# Altium footprint library BWRC.PcbLib: 51 footprints (part 2 of 4)
Each footprint in its own frame and in the unit in brackets; x right, y up, seen from the top. Pads: shape width x height; smd on the part's side, far side on the other; paste and mask are expansions set on the pad; w line width, h text height; cw(c..) or ccw(c..) is an arc to the next point about the centre after c.
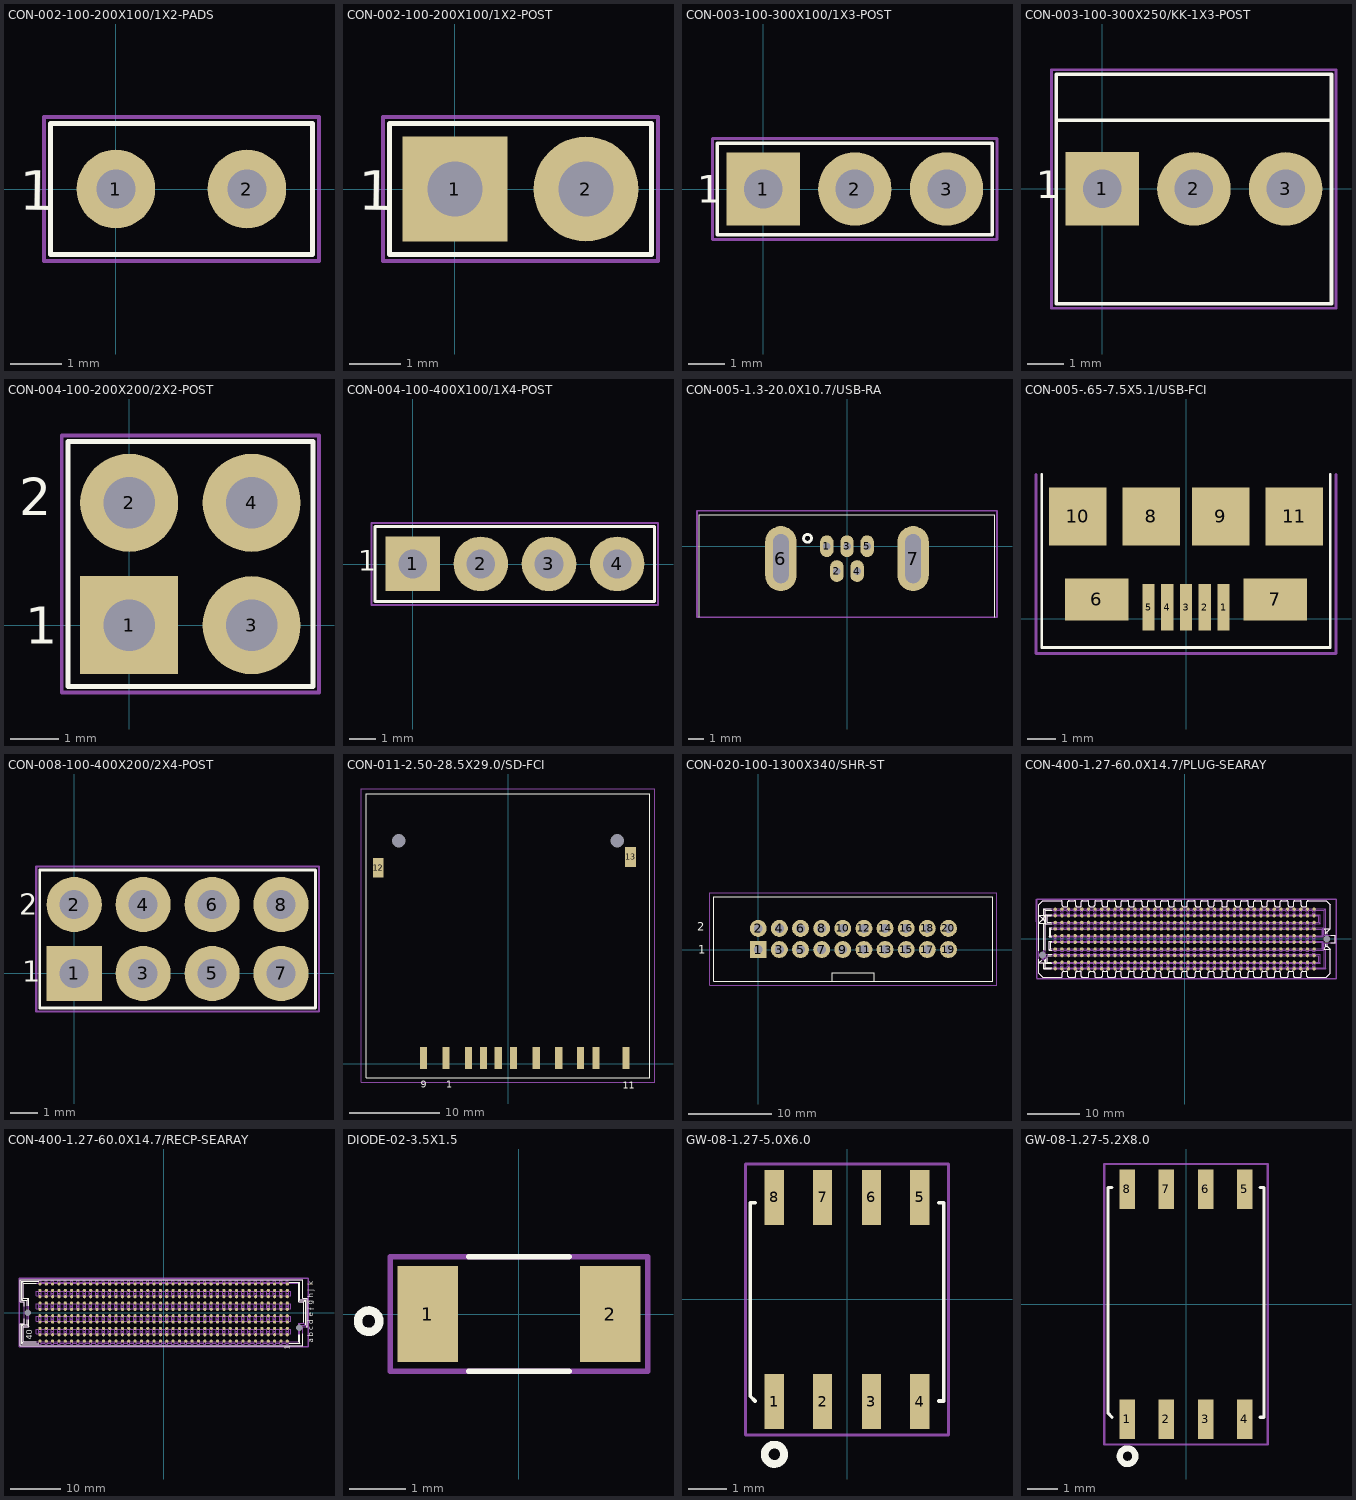
[diagram p1: the footprints below, top view; thin cyan lines are the x and y axes]

## CON-002-100-200X100/1X2-PADS [mil] "2 thru pads"
height 43.31
pads (2):
  round 60 hole 30: 1(0,0) 2(100,0)
Top Overlay:
  lines w4: -50,-50 -50,50 150,50 150,-50 -50,-50
  text "1" at -74,-16 h30
M15_Courtyard_Top:
  lines w3: -55,-55 155,-55 155,55 -55,55 -55,-55

## CON-002-100-200X100/1X2-POST [mil] "2 pin"
height 43.31
pads (2):
  rect 80x80 hole 42: 1(0,0)
  round 80 hole 42: 2(100,0)
Top Overlay:
  lines w4: -50,-50 -50,50 150,50 150,-50 -50,-50
  text "1" at -74,-16 h30
M15_Courtyard_Top:
  lines w3: -55,-55 155,-55 155,55 -55,55 -55,-55

## CON-003-100-300X100/1X3-POST [mil] "3-pin"
pads (3):
  rect 80x80 hole 42: 1(0,0)
  round 80 hole 42: 2(100,0) 3(200,0)
Top Overlay:
  lines w4: -50,-50 250,-50 250,50 -50,50 -50,-50
  text "1" at -72,-15 h30
M15_Courtyard_Top:
  lines w3: -55,-55 255,-55 255,55 -55,55 -55,-55

## CON-003-100-300X250/KK-1X3-POST [mil]
pads (3):
  rect 80x80 hole 42: 1(0,0)
  round 80 hole 42: 2(100.1,0) 3(200.1,0)
Top Overlay:
  lines w4: -50,75 250.1,75 ; -50,-125.1 250.1,-125.1 250.1,125 -50,125 -50,-125.1
  text "1" at -72,-10.1 h30
M15_Courtyard_Top:
  lines w3: -55,-130.1 -55,129.9 255,129.9 255,-130.1 -55,-130.1

## CON-004-100-200X200/2X2-POST [mil]
pads (4):
  rect 80x80 hole 42: 1(0,0)
  round 80 hole 42: 2(0,100) 3(100,0) 4(100,100)
Top Overlay:
  lines w4: -50,-50 150,-50 150,150 -50,150 -50,-50
  text "2" at -90,90 h30
  text "1" at -85,-15 h30
M15_Courtyard_Top:
  lines w3: -55,-55 155,-55 155,155 -55,155 -55,-55

## CON-004-100-400X100/1X4-POST [mil]
pads (4):
  rect 80x80 hole 42: 1(0.1,0.1)
  round 80 hole 42: 2(100.1,0.1) 3(200.1,0.1) 4(300.1,0.1)
Top Overlay:
  lines w4: -55,-55 -55,55 355,55 355,-55 -55,-55
  text "1" at -80,-10 h30
M15_Courtyard_Top:
  lines w3: -60,-60 -60,60 360,60 360,-60 -60,-60

## CON-005-1.3-20.0X10.7/USB-RA [mil]
pads (7):
  rrect98% 34x55 hole 19: 1(-51.18,0) 2(-25.59,-62.99) 3(0,0) 4(25.59,-62.99) 5(51.18,0)
  oval 80x164.96 hole 39.37 slot 124.02 at 90 deg: 6(-167.32,-31.5) 7(167.32,-31.5)
Top Overlay:
  circle w7: c-100,20 r10
  lines w3: -374.02,-179.98 -374.02,80 374.02,80 374.02,-179.98
M15_Courtyard_Top:
  lines w4: -380,-180 380,-180 380,90 -380,90 -380,-180

## CON-005-.65-7.5X5.1/USB-FCI [mm]
pads (11):
  rect 0.43x1.6 smd: 1(1.3,0.4) 2(0.65,0.4) 3(0,0.4) 4(-0.65,0.4) 5(-1.3,0.4)
  rect 2.2x1.45 smd: 6(-3.1,0.675) 7(3.1,0.675)
  rect 2x2 smd: 8(-1.2,3.55) 9(1.2,3.55) 10(-3.75,3.55) 11(3.75,3.55)
Top Overlay:
  lines w0.102: -5,5 -5,-1 5,-1 5,5
M15_Courtyard_Top:
  lines w0.102: -5.2,5 -5.2,-1.2 5.2,-1.2 5.2,5

## CON-008-100-400X200/2X4-POST [mil]
height 100
pads (8):
  rect 80x80 hole 42: 1(0,0)
  round 80 hole 42: 2(0,100) 3(100,0) 4(100,100) 5(200,0) 6(200,100) 7(300,0) 8(300,100)
Top Overlay:
  lines w4: -50,-50 350,-50 350,150 -50,150 -50,-50
  text "2" at -80,85 h30
  text "1" at -75,-12 h30
M15_Courtyard_Top:
  lines w3: -55,-55 355,-55 355,155 -55,155 -55,-55

## CON-011-2.50-28.5X29.0/SD-FCI [mm]
pads (15):
  rect 0.8x2.45 smd: 1(-6.875,0.625) 2(-4.375,0.625) 3(-1.075,0.625) 4(0.625,0.625) 5(3.125,0.625) 6(5.625,0.625) 7(8.05,0.625) 8(9.75,0.625) 9(-9.375,0.625) 10(-2.725,0.625) 11(13.1,0.625)
  rect 1.2x2.2 smd: 12(-14.4,21.75) 13(13.6,22.95)
  round 0 hole 1.5 unplated: 14(-12.1,24.75) 15(12.1,24.75)
Top Overlay:
  lines w0.102: -15.748,-1.524 15.748,-1.524 15.748,29.972 -15.748,29.972 -15.748,-1.524
  text "11" at 12.7,-2.794 h0.76
  text "1" at -6.858,-2.667 h0.76
  text "9" at -9.652,-2.667 h0.76
M15_Courtyard_Top:
  lines w0.076: -16.256,-2.032 -16.256,30.48 16.256,30.48 16.256,-2.032 ; -16.256,-2.032 16.256,-2.032 ; -16.256,-2.032 16.256,-2.032
  text "11" at 20.066,-6.096 h0.76

## CON-020-100-1300X340/SHR-ST [mil]
pads (20):
  rect 80x80 hole 42: 1(0,0)
  round 80 hole 42: 2(0,100.1) 3(100,0) 4(100,100.1) 5(200,0) 6(200,100.1) 7(300,0) 8(300,100.1) 9(400,0) 10(400,100.1) 11(500.1,0) 12(500.1,100.1) 13(600.1,0) 14(600.1,100.1) 15(700.1,0) 16(700.1,100.1) 17(800.1,0) 18(800.1,100.1) 19(900.1,0) 20(900.1,100.1)
Top Overlay:
  lines w4: 350,-150 350,-110 550.1,-110 550.1,-149.9 ; -210,-150 -210,250 1110,250 1110,-150 -210,-150
  text "2" at -290,90 h40
  text "1" at -285,-20 h40
M15_Courtyard_Top:
  lines w3: -230,-170 1130,-170 1130,270 -230,270 -230,-170

## CON-400-1.27-60.0X14.7/PLUG-SEARAY [mm] "Connector VITA 57, 400 Male contacts in 10 rows abcdefghij"
height 6.1
pads (402):
  oval 0x1 hole 1.3 unplated: 1(-27.191,-3.048) 2(27.191,0)
  round 0.64 smd: a1(24.765,5.715) a2(23.495,5.715) a3(22.225,5.715) a4(20.955,5.715) a5(19.685,5.715) a6(18.415,5.715) a7(17.145,5.715) a8(15.875,5.715) a9(14.605,5.715) a10(13.335,5.715) a11(12.065,5.715) a12(10.795,5.715) a13(9.525,5.715) a14(8.255,5.715) a15(6.985,5.715) a16(5.715,5.715) a17(4.445,5.715) a18(3.175,5.715) a19(1.905,5.715) a20(0.635,5.715) a21(-0.635,5.715) a22(-1.905,5.715) a23(-3.175,5.715) a24(-4.445,5.715) a25(-5.715,5.715) a26(-6.985,5.715) a27(-8.255,5.715) a28(-9.525,5.715) a29(-10.795,5.715) a30(-12.065,5.715) a31(-13.335,5.715) a32(-14.605,5.715) a33(-15.875,5.715) a34(-17.145,5.715) a35(-18.415,5.715) a36(-19.685,5.715) a37(-20.955,5.715) a38(-22.225,5.715) a39(-23.495,5.715) a40(-24.765,5.715) b1(24.765,4.445) b2(23.495,4.445) b3(22.225,4.445) b4(20.955,4.445) b5(19.685,4.445) b6(18.415,4.445) b7(17.145,4.445) b8(15.875,4.445) b9(14.605,4.445) b10(13.335,4.445) b11(12.065,4.445) b12(10.795,4.445) b13(9.525,4.445) b14(8.255,4.445) b15(6.985,4.445) b16(5.715,4.445) b17(4.445,4.445) b18(3.175,4.445) b19(1.905,4.445) b20(0.635,4.445) b21(-0.635,4.445) b22(-1.905,4.445) b23(-3.175,4.445) b24(-4.445,4.445) b25(-5.715,4.445) b26(-6.985,4.445) b27(-8.255,4.445) b28(-9.525,4.445) b29(-10.795,4.445) b30(-12.065,4.445) b31(-13.335,4.445) b32(-14.605,4.445) b33(-15.875,4.445) b34(-17.145,4.445) b35(-18.415,4.445) b36(-19.685,4.445) b37(-20.955,4.445) b38(-22.225,4.445) b39(-23.495,4.445) b40(-24.765,4.445) c1(24.765,3.175) c2(23.495,3.175) c3(22.225,3.175) c4(20.955,3.175) c5(19.685,3.175) c6(18.415,3.175) c7(17.145,3.175) c8(15.875,3.175) c9(14.605,3.175) c10(13.335,3.175) c11(12.065,3.175) c12(10.795,3.175) c13(9.525,3.175) c14(8.255,3.175) c15(6.985,3.175) c16(5.715,3.175) c17(4.445,3.175) c18(3.175,3.175) c19(1.905,3.175) c20(0.635,3.175) c21(-0.635,3.175) c22(-1.905,3.175) c23(-3.175,3.175) c24(-4.445,3.175) c25(-5.715,3.175) c26(-6.985,3.175) c27(-8.255,3.175) c28(-9.525,3.175) c29(-10.795,3.175) c30(-12.065,3.175) c31(-13.335,3.175) c32(-14.605,3.175) c33(-15.875,3.175) c34(-17.145,3.175) c35(-18.415,3.175) c36(-19.685,3.175) c37(-20.955,3.175) c38(-22.225,3.175) c39(-23.495,3.175) c40(-24.765,3.175) d1(24.765,1.905) d2(23.495,1.905) d3(22.225,1.905) d4(20.955,1.905) d5(19.685,1.905) d6(18.415,1.905) d7(17.145,1.905) d8(15.875,1.905) d9(14.605,1.905) d10(13.335,1.905) d11(12.065,1.905) d12(10.795,1.905) d13(9.525,1.905) d14(8.255,1.905) d15(6.985,1.905) d16(5.715,1.905) d17(4.445,1.905) d18(3.175,1.905) d19(1.905,1.905) d20(0.635,1.905) d21(-0.635,1.905) d22(-1.905,1.905) d23(-3.175,1.905) d24(-4.445,1.905) d25(-5.715,1.905) d26(-6.985,1.905) d27(-8.255,1.905) d28(-9.525,1.905) d29(-10.795,1.905) d30(-12.065,1.905) d31(-13.335,1.905) d32(-14.605,1.905) d33(-15.875,1.905) d34(-17.145,1.905) d35(-18.415,1.905) d36(-19.685,1.905) d37(-20.955,1.905) d38(-22.225,1.905) d39(-23.495,1.905) d40(-24.765,1.905) e1(24.765,0.635) e2(23.495,0.635) e3(22.225,0.635) e4(20.955,0.635) e5(19.685,0.635) e6(18.415,0.635) e7(17.145,0.635) e8(15.875,0.635) e9(14.605,0.635) e10(13.335,0.635) e11(12.065,0.635) e12(10.795,0.635) e13(9.525,0.635) e14(8.255,0.635) e15(6.985,0.635) e16(5.715,0.635) e17(4.445,0.635) e18(3.175,0.635) e19(1.905,0.635) e20(0.635,0.635) e21(-0.635,0.635) e22(-1.905,0.635) e23(-3.175,0.635) e24(-4.445,0.635) e25(-5.715,0.635) e26(-6.985,0.635) e27(-8.255,0.635) e28(-9.525,0.635) e29(-10.795,0.635) e30(-12.065,0.635) e31(-13.335,0.635) e32(-14.605,0.635) e33(-15.875,0.635) e34(-17.145,0.635) e35(-18.415,0.635) e36(-19.685,0.635) e37(-20.955,0.635) e38(-22.225,0.635) e39(-23.495,0.635) e40(-24.765,0.635) f1(24.765,-0.635) f2(23.495,-0.635) f3(22.225,-0.635) f4(20.955,-0.635) f5(19.685,-0.635) f6(18.415,-0.635) f7(17.145,-0.635) f8(15.875,-0.635) f9(14.605,-0.635) f10(13.335,-0.635) f11(12.065,-0.635) f12(10.795,-0.635) f13(9.525,-0.635) f14(8.255,-0.635) f15(6.985,-0.635) f16(5.715,-0.635) f17(4.445,-0.635) f18(3.175,-0.635) f19(1.905,-0.635) f20(0.635,-0.635) f21(-0.635,-0.635) f22(-1.905,-0.635) f23(-3.175,-0.635) f24(-4.445,-0.635) f25(-5.715,-0.635) f26(-6.985,-0.635) f27(-8.255,-0.635) f28(-9.525,-0.635) f29(-10.795,-0.635) f30(-12.065,-0.635) f31(-13.335,-0.635) f32(-14.605,-0.635) f33(-15.875,-0.635) f34(-17.145,-0.635) f35(-18.415,-0.635) f36(-19.685,-0.635) f37(-20.955,-0.635) f38(-22.225,-0.635) f39(-23.495,-0.635) f40(-24.765,-0.635) g1(24.765,-1.905) g2(23.495,-1.905) g3(22.225,-1.905) g4(20.955,-1.905) g5(19.685,-1.905) g6(18.415,-1.905) g7(17.145,-1.905) g8(15.875,-1.905) g9(14.605,-1.905) g10(13.335,-1.905) g11(12.065,-1.905) g12(10.795,-1.905) g13(9.525,-1.905) g14(8.255,-1.905) g15(6.985,-1.905) g16(5.715,-1.905) g17(4.445,-1.905) g18(3.175,-1.905) g19(1.905,-1.905) g20(0.635,-1.905) g21(-0.635,-1.905) g22(-1.905,-1.905) g23(-3.175,-1.905) g24(-4.445,-1.905) g25(-5.715,-1.905) g26(-6.985,-1.905) g27(-8.255,-1.905) g28(-9.525,-1.905) g29(-10.795,-1.905) g30(-12.065,-1.905) g31(-13.335,-1.905) g32(-14.605,-1.905) g33(-15.875,-1.905) g34(-17.145,-1.905) g35(-18.415,-1.905) g36(-19.685,-1.905) g37(-20.955,-1.905) g38(-22.225,-1.905) g39(-23.495,-1.905) g40(-24.765,-1.905) h1(24.765,-3.175) h2(23.495,-3.175) h3(22.225,-3.175) h4(20.955,-3.175) h5(19.685,-3.175) h6(18.415,-3.175) h7(17.145,-3.175) h8(15.875,-3.175) h9(14.605,-3.175) h10(13.335,-3.175) h11(12.065,-3.175) h12(10.795,-3.175) h13(9.525,-3.175) h14(8.255,-3.175) h15(6.985,-3.175) h16(5.715,-3.175) h17(4.445,-3.175) h18(3.175,-3.175) h19(1.905,-3.175) h20(0.635,-3.175) h21(-0.635,-3.175) h22(-1.905,-3.175) h23(-3.175,-3.175) h24(-4.445,-3.175) h25(-5.715,-3.175) h26(-6.985,-3.175) h27(-8.255,-3.175) h28(-9.525,-3.175) h29(-10.795,-3.175) h30(-12.065,-3.175) h31(-13.335,-3.175) h32(-14.605,-3.175) h33(-15.875,-3.175) h34(-17.145,-3.175) h35(-18.415,-3.175) h36(-19.685,-3.175) h37(-20.955,-3.175) h38(-22.225,-3.175) h39(-23.495,-3.175) h40(-24.765,-3.175) j1(24.765,-4.445) j2(23.495,-4.445) j3(22.225,-4.445) j4(20.955,-4.445) j5(19.685,-4.445) j6(18.415,-4.445) j7(17.145,-4.445) j8(15.875,-4.445) j9(14.605,-4.445) j10(13.335,-4.445) j11(12.065,-4.445) j12(10.795,-4.445) j13(9.525,-4.445) j14(8.255,-4.445) j15(6.985,-4.445) j16(5.715,-4.445) j17(4.445,-4.445) j18(3.175,-4.445) j19(1.905,-4.445) j20(0.635,-4.445) j21(-0.635,-4.445) j22(-1.905,-4.445) j23(-3.175,-4.445) j24(-4.445,-4.445) j25(-5.715,-4.445) j26(-6.985,-4.445) j27(-8.255,-4.445) j28(-9.525,-4.445) j29(-10.795,-4.445) j30(-12.065,-4.445) j31(-13.335,-4.445) j32(-14.605,-4.445) j33(-15.875,-4.445) j34(-17.145,-4.445) j35(-18.415,-4.445) j36(-19.685,-4.445) j37(-20.955,-4.445) j38(-22.225,-4.445) j39(-23.495,-4.445) j40(-24.765,-4.445) k1(24.765,-5.715) k2(23.495,-5.715) k3(22.225,-5.715) k4(20.955,-5.715) k5(19.685,-5.715) k6(18.415,-5.715) k7(17.145,-5.715) k8(15.875,-5.715) k9(14.605,-5.715) k10(13.335,-5.715) k11(12.065,-5.715) k12(10.795,-5.715) k13(9.525,-5.715) k14(8.255,-5.715) k15(6.985,-5.715) k16(5.715,-5.715) k17(4.445,-5.715) k18(3.175,-5.715) k19(1.905,-5.715) k20(0.635,-5.715) k21(-0.635,-5.715) k22(-1.905,-5.715) k23(-3.175,-5.715) k24(-4.445,-5.715) k25(-5.715,-5.715) k26(-6.985,-5.715) k27(-8.255,-5.715) k28(-9.525,-5.715) k29(-10.795,-5.715) k30(-12.065,-5.715) k31(-13.335,-5.715) k32(-14.605,-5.715) k33(-15.875,-5.715) k34(-17.145,-5.715) k35(-18.415,-5.715) k36(-19.685,-5.715) k37(-20.955,-5.715) k38(-22.225,-5.715) k39(-23.495,-5.715) k40(-24.765,-5.715)
Top Overlay:
  drawing of 637 lines, arcs and shapes, not listed
Bottom Overlay:
  text "j" at -28.448,-4.064 h1
  text "g" at -28.702,-1.524 h1
  text "a" at -28.448,6.223 h1
  text "d" at -28.448,2.286 h1
  text "k" at -28.321,-5.207 h1
  text "h" at -28.448,-2.794 h1
  text "f" at -28.448,-0.381 h1
  text "e" at -28.575,1.016 h1
  text "c" at -28.448,3.683 h1
  text "b" at -28.448,4.826 h1
  text "40" at -24.003,6.858 h1.02
  text "1" at 25.019,6.858 h1.02
M6_Assembly_Top:
  drawing of 4433 lines, arcs and shapes, not listed
  text "1" at 24.24,-7.438 h1
M15_Courtyard_Top:
  lines w0: -28.448,3.302 -28.448,7.62 -28.321,7.62
  lines w0.254: -28.321,-7.62 28.956,-7.62 28.956,7.62 -28.321,7.62 -28.321,-7.493
3D body "SAMTEC_ASP-134488-01.stp": height 5.61, standoff -1.27, extent -27.889,-7.341 28.778,7.341

## CON-400-1.27-60.0X14.7/RECP-SEARAY [mm] "Connector VITA 57, 400 Female contacts in 10 rows abcdefghij"
height 6.55
pads (402):
  oval 0x1 hole 1.3 unplated: 1(-27.19,0) 2(27.19,-3.05)
  round 0.64 smd: a1(24.765,-5.715) a2(23.495,-5.715) a3(22.225,-5.715) a4(20.955,-5.715) a5(19.685,-5.715) a6(18.415,-5.715) a7(17.145,-5.715) a8(15.875,-5.715) a9(14.605,-5.715) a10(13.335,-5.715) a11(12.065,-5.715) a12(10.795,-5.715) a13(9.525,-5.715) a14(8.255,-5.715) a15(6.985,-5.715) a16(5.715,-5.715) a17(4.445,-5.715) a18(3.175,-5.715) a19(1.905,-5.715) a20(0.635,-5.715) a21(-0.635,-5.715) a22(-1.905,-5.715) a23(-3.175,-5.715) a24(-4.445,-5.715) a25(-5.715,-5.715) a26(-6.985,-5.715) a27(-8.255,-5.715) a28(-9.525,-5.715) a29(-10.795,-5.715) a30(-12.065,-5.715) a31(-13.335,-5.715) a32(-14.605,-5.715) a33(-15.875,-5.715) a34(-17.145,-5.715) a35(-18.415,-5.715) a36(-19.685,-5.715) a37(-20.955,-5.715) a38(-22.225,-5.715) a39(-23.495,-5.715) a40(-24.765,-5.715) b1(24.765,-4.445) b2(23.495,-4.445) b3(22.225,-4.445) b4(20.955,-4.445) b5(19.685,-4.445) b6(18.415,-4.445) b7(17.145,-4.445) b8(15.875,-4.445) b9(14.605,-4.445) b10(13.335,-4.445) b11(12.065,-4.445) b12(10.795,-4.445) b13(9.525,-4.445) b14(8.255,-4.445) b15(6.985,-4.445) b16(5.715,-4.445) b17(4.445,-4.445) b18(3.175,-4.445) b19(1.905,-4.445) b20(0.635,-4.445) b21(-0.635,-4.445) b22(-1.905,-4.445) b23(-3.175,-4.445) b24(-4.445,-4.445) b25(-5.715,-4.445) b26(-6.985,-4.445) b27(-8.255,-4.445) b28(-9.525,-4.445) b29(-10.795,-4.445) b30(-12.065,-4.445) b31(-13.335,-4.445) b32(-14.605,-4.445) b33(-15.875,-4.445) b34(-17.145,-4.445) b35(-18.415,-4.445) b36(-19.685,-4.445) b37(-20.955,-4.445) b38(-22.225,-4.445) b39(-23.495,-4.445) b40(-24.765,-4.445) c1(24.765,-3.175) c2(23.495,-3.175) c3(22.225,-3.175) c4(20.955,-3.175) c5(19.685,-3.175) c6(18.415,-3.175) c7(17.145,-3.175) c8(15.875,-3.175) c9(14.605,-3.175) c10(13.335,-3.175) c11(12.065,-3.175) c12(10.795,-3.175) c13(9.525,-3.175) c14(8.255,-3.175) c15(6.985,-3.175) c16(5.715,-3.175) c17(4.445,-3.175) c18(3.175,-3.175) c19(1.905,-3.175) c20(0.635,-3.175) c21(-0.635,-3.175) c22(-1.905,-3.175) c23(-3.175,-3.175) c24(-4.445,-3.175) c25(-5.715,-3.175) c26(-6.985,-3.175) c27(-8.255,-3.175) c28(-9.525,-3.175) c29(-10.795,-3.175) c30(-12.065,-3.175) c31(-13.335,-3.175) c32(-14.605,-3.175) c33(-15.875,-3.175) c34(-17.145,-3.175) c35(-18.415,-3.175) c36(-19.685,-3.175) c37(-20.955,-3.175) c38(-22.225,-3.175) c39(-23.495,-3.175) c40(-24.765,-3.175) d1(24.765,-1.905) d2(23.495,-1.905) d3(22.225,-1.905) d4(20.955,-1.905) d5(19.685,-1.905) d6(18.415,-1.905) d7(17.145,-1.905) d8(15.875,-1.905) d9(14.605,-1.905) d10(13.335,-1.905) d11(12.065,-1.905) d12(10.795,-1.905) d13(9.525,-1.905) d14(8.255,-1.905) d15(6.985,-1.905) d16(5.715,-1.905) d17(4.445,-1.905) d18(3.175,-1.905) d19(1.905,-1.905) d20(0.635,-1.905) d21(-0.635,-1.905) d22(-1.905,-1.905) d23(-3.175,-1.905) d24(-4.445,-1.905) d25(-5.715,-1.905) d26(-6.985,-1.905) d27(-8.255,-1.905) d28(-9.525,-1.905) d29(-10.795,-1.905) d30(-12.065,-1.905) d31(-13.335,-1.905) d32(-14.605,-1.905) d33(-15.875,-1.905) d34(-17.145,-1.905) d35(-18.415,-1.905) d36(-19.685,-1.905) d37(-20.955,-1.905) d38(-22.225,-1.905) d39(-23.495,-1.905) d40(-24.765,-1.905) e1(24.765,-0.635) e2(23.495,-0.635) e3(22.225,-0.635) e4(20.955,-0.635) e5(19.685,-0.635) e6(18.415,-0.635) e7(17.145,-0.635) e8(15.875,-0.635) e9(14.605,-0.635) e10(13.335,-0.635) e11(12.065,-0.635) e12(10.795,-0.635) e13(9.525,-0.635) e14(8.255,-0.635) e15(6.985,-0.635) e16(5.715,-0.635) e17(4.445,-0.635) e18(3.175,-0.635) e19(1.905,-0.635) e20(0.635,-0.635) e21(-0.635,-0.635) e22(-1.905,-0.635) e23(-3.175,-0.635) e24(-4.445,-0.635) e25(-5.715,-0.635) e26(-6.985,-0.635) e27(-8.255,-0.635) e28(-9.525,-0.635) e29(-10.795,-0.635) e30(-12.065,-0.635) e31(-13.335,-0.635) e32(-14.605,-0.635) e33(-15.875,-0.635) e34(-17.145,-0.635) e35(-18.415,-0.635) e36(-19.685,-0.635) e37(-20.955,-0.635) e38(-22.225,-0.635) e39(-23.495,-0.635) e40(-24.765,-0.635) f1(24.765,0.635) f2(23.495,0.635) f3(22.225,0.635) f4(20.955,0.635) f5(19.685,0.635) f6(18.415,0.635) f7(17.145,0.635) f8(15.875,0.635) f9(14.605,0.635) f10(13.335,0.635) f11(12.065,0.635) f12(10.795,0.635) f13(9.525,0.635) f14(8.255,0.635) f15(6.985,0.635) f16(5.715,0.635) f17(4.445,0.635) f18(3.175,0.635) f19(1.905,0.635) f20(0.635,0.635) f21(-0.635,0.635) f22(-1.905,0.635) f23(-3.175,0.635) f24(-4.445,0.635) f25(-5.715,0.635) f26(-6.985,0.635) f27(-8.255,0.635) f28(-9.525,0.635) f29(-10.795,0.635) f30(-12.065,0.635) f31(-13.335,0.635) f32(-14.605,0.635) f33(-15.875,0.635) f34(-17.145,0.635) f35(-18.415,0.635) f36(-19.685,0.635) f37(-20.955,0.635) f38(-22.225,0.635) f39(-23.495,0.635) f40(-24.765,0.635) g1(24.765,1.905) g2(23.495,1.905) g3(22.225,1.905) g4(20.955,1.905) g5(19.685,1.905) g6(18.415,1.905) g7(17.145,1.905) g8(15.875,1.905) g9(14.605,1.905) g10(13.335,1.905) g11(12.065,1.905) g12(10.795,1.905) g13(9.525,1.905) g14(8.255,1.905) g15(6.985,1.905) g16(5.715,1.905) g17(4.445,1.905) g18(3.175,1.905) g19(1.905,1.905) g20(0.635,1.905) g21(-0.635,1.905) g22(-1.905,1.905) g23(-3.175,1.905) g24(-4.445,1.905) g25(-5.715,1.905) g26(-6.985,1.905) g27(-8.255,1.905) g28(-9.525,1.905) g29(-10.795,1.905) g30(-12.065,1.905) g31(-13.335,1.905) g32(-14.605,1.905) g33(-15.875,1.905) g34(-17.145,1.905) g35(-18.415,1.905) g36(-19.685,1.905) g37(-20.955,1.905) g38(-22.225,1.905) g39(-23.495,1.905) g40(-24.765,1.905) h1(24.765,3.175) h2(23.495,3.175) h3(22.225,3.175) h4(20.955,3.175) h5(19.685,3.175) h6(18.415,3.175) h7(17.145,3.175) h8(15.875,3.175) h9(14.605,3.175) h10(13.335,3.175) h11(12.065,3.175) h12(10.795,3.175) h13(9.525,3.175) h14(8.255,3.175) h15(6.985,3.175) h16(5.715,3.175) h17(4.445,3.175) h18(3.175,3.175) h19(1.905,3.175) h20(0.635,3.175) h21(-0.635,3.175) h22(-1.905,3.175) h23(-3.175,3.175) h24(-4.445,3.175) h25(-5.715,3.175) h26(-6.985,3.175) h27(-8.255,3.175) h28(-9.525,3.175) h29(-10.795,3.175) h30(-12.065,3.175) h31(-13.335,3.175) h32(-14.605,3.175) h33(-15.875,3.175) h34(-17.145,3.175) h35(-18.415,3.175) h36(-19.685,3.175) h37(-20.955,3.175) h38(-22.225,3.175) h39(-23.495,3.175) h40(-24.765,3.175) j1(24.765,4.445) j2(23.495,4.445) j3(22.225,4.445) j4(20.955,4.445) j5(19.685,4.445) j6(18.415,4.445) j7(17.145,4.445) j8(15.875,4.445) j9(14.605,4.445) j10(13.335,4.445) j11(12.065,4.445) j12(10.795,4.445) j13(9.525,4.445) j14(8.255,4.445) j15(6.985,4.445) j16(5.715,4.445) j17(4.445,4.445) j18(3.175,4.445) j19(1.905,4.445) j20(0.635,4.445) j21(-0.635,4.445) j22(-1.905,4.445) j23(-3.175,4.445) j24(-4.445,4.445) j25(-5.715,4.445) j26(-6.985,4.445) j27(-8.255,4.445) j28(-9.525,4.445) j29(-10.795,4.445) j30(-12.065,4.445) j31(-13.335,4.445) j32(-14.605,4.445) j33(-15.875,4.445) j34(-17.145,4.445) j35(-18.415,4.445) j36(-19.685,4.445) j37(-20.955,4.445) j38(-22.225,4.445) j39(-23.495,4.445) j40(-24.765,4.445) k1(24.765,5.715) k2(23.495,5.715) k3(22.225,5.715) k4(20.955,5.715) k5(19.685,5.715) k6(18.415,5.715) k7(17.145,5.715) k8(15.875,5.715) k9(14.605,5.715) k10(13.335,5.715) k11(12.065,5.715) k12(10.795,5.715) k13(9.525,5.715) k14(8.255,5.715) k15(6.985,5.715) k16(5.715,5.715) k17(4.445,5.715) k18(3.175,5.715) k19(1.905,5.715) k20(0.635,5.715) k21(-0.635,5.715) k22(-1.905,5.715) k23(-3.175,5.715) k24(-4.445,5.715) k25(-5.715,5.715) k26(-6.985,5.715) k27(-8.255,5.715) k28(-9.525,5.715) k29(-10.795,5.715) k30(-12.065,5.715) k31(-13.335,5.715) k32(-14.605,5.715) k33(-15.875,5.715) k34(-17.145,5.715) k35(-18.415,5.715) k36(-19.685,5.715) k37(-20.955,5.715) k38(-22.225,5.715) k39(-23.495,5.715) k40(-24.765,5.715)
Top Overlay:
  lines w0.2: -27.889,-1.213 -27.889,-2.197 -28.727,-2.197 -28.727,-6.617 27.889,-6.617 27.889,-4.263 ; -27.889,1.213 -27.889,2.197 -28.727,2.197 -28.727,6.617 27.889,6.617 27.889,2.845 28.727,2.845 28.727,-2.845 28.575,-2.845 ; -27.305,-1.395 -27.305,-2.477 ; -27.305,1.395 -27.305,2.476 ; -27.051,-1.393 -27.051,-2.858 ; -27.051,1.393 -27.051,2.857 ; -25.5,-5.855 -28.067,-5.855 ; -25.5,5.855 -28.067,5.855 ; -24.994,-6.236 -28.448,-6.236 ; -24.994,6.236 -28.448,6.236 ; 25.2,-6.109 27.305,-6.109 ; 25.2,6.109 27.305,6.109 ; 27.051,-4.443 27.051,-5.855 27.305,-6.109 ; 27.305,-4.445 27.305,-6.109 ; 28.067,-1.959 28.067,2.184 ; 28.448,-2.436 28.448,2.565 ; -28.448,-6.236 -28.067,-5.855 ; -28.448,-6.236 -28.448,-2.477 ; -28.448,-2.477 -28.067,-2.858 ; -28.448,-2.477 -27.305,-2.477 ; -28.448,2.476 -28.067,2.857 ; -28.448,2.476 -27.305,2.476 ; -28.448,2.476 -28.448,6.236 ; -28.448,6.236 -28.067,5.855 ; -28.067,-5.855 -28.067,-2.858 ; -28.067,-2.858 -27.051,-2.858 ; -28.067,2.857 -28.067,5.855 ; -28.067,2.857 -27.051,2.857 ; -27.305,-2.477 -27.051,-2.858 ; -27.305,2.476 -27.051,2.857 ; 27.051,2.184 27.305,2.565 ; 27.051,2.184 28.067,2.184 ; 27.051,2.184 27.051,5.855 27.305,6.109 ; 27.305,2.565 27.305,6.109 ; 27.305,2.565 28.448,2.565 ; 28.067,2.184 28.448,2.565
  text "1" at 25.29,-7.438 h1
  text "40" at -26.289,-5.461 h1.2
  text "c" at 29.972,-3.556 h1
  text "e" at 29.949,-0.836 h1
  text "f" at 30.116,0.436 h1
  text "h" at 29.972,2.921 h1
  text "j" at 29.989,4.246 h1
  text "a" at 29.972,-6.096 h1
  text "b" at 29.972,-4.826 h1
  text "d" at 29.989,-2.392 h1
  text "g" at 29.862,1.579 h1
  text "k" at 29.989,5.516 h1
M6_Assembly_Top:
  drawing of 1424 lines, arcs and shapes, not listed
  text "40" at -26.289,-5.461 h1.2
  text "1" at 25.29,-7.438 h1
  text "abcdefghjk" at 30.48,-6.223 h1.27
M15_Courtyard_Top:
  lines w0.254: -28.956,-6.858 26.416,-6.858 28.956,-6.858 28.956,-4.064 28.956,6.858 -28.956,6.858 -28.956,-6.858
3D body "SAMTEC_ASP-134486-01.stp": height 6.55, standoff -1.27, extent -28.727,-6.618 28.727,6.618

## DIODE-02-3.5X1.5 [mm]
pads (2):
  rect 1.07x1.7 smd: 1(-1.62,0) 2(1.62,0)
Top Overlay:
  circle w0.15: c-2.667,-0.127 r0.19
  lines w0.102: -0.889,-1.016 0.889,-1.016 ; -0.889,1.016 0.889,1.016
M15_Courtyard_Top:
  lines w0.102: -2.286,-1.016 -2.286,1.016 2.286,1.016 2.286,-1.016 -2.286,-1.016

## GW-08-1.27-5.0X6.0 [mm]
pads (8):
  rect 0.5x1.44 smd: 1(-1.91,-2.68) 2(-0.64,-2.68) 3(0.64,-2.68) 4(1.91,-2.68) 5(1.91,2.68) 6(0.64,2.68) 7(-0.64,2.68) 8(-1.91,2.68)
Top Overlay:
  circle w0.203: c-1.905,-4.064 r0.254
  lines w0.102: -2.413,-2.667 -2.54,-2.54 -2.54,2.54 -2.413,2.54 ; 2.413,-2.667 2.54,-2.667 2.54,2.54 2.413,2.54
M15_Courtyard_Top:
  lines w0.076: -2.667,-3.556 -2.667,3.556 2.667,3.556 2.667,-0.508 2.667,-3.556 -2.667,-3.556

## GW-08-1.27-5.2X8.0 [mm]
pads (8):
  rect 0.5x1.3 smd: 1(-1.91,-3.75) 2(-0.64,-3.75) 3(0.64,-3.75) 4(1.91,-3.75) 5(1.91,3.75) 6(0.64,3.75) 7(-0.64,3.75) 8(-1.91,3.75)
Top Overlay:
  circle w0.203: c-1.905,-4.953 r0.254
  lines w0.102: -2.413,-3.683 -2.54,-3.556 -2.54,3.81 -2.413,3.81 ; 2.413,-3.683 2.54,-3.683 2.54,3.81 2.413,3.81
M15_Courtyard_Top:
  lines w0.076: -2.667,-4.572 2.667,-4.572 2.667,4.572 -2.667,4.572 -2.667,-4.572